# Altium footprint library connectors.PCBLIB: 188 footprints (part 3 of 12)
Each footprint in its own frame and in the unit in brackets; x right, y up, seen from the top. Pads: shape width x height; smd on the part's side, far side on the other; paste and mask are expansions set on the pad; w line width, h text height; cw(c..) or ccw(c..) is an arc to the next point about the centre after c.
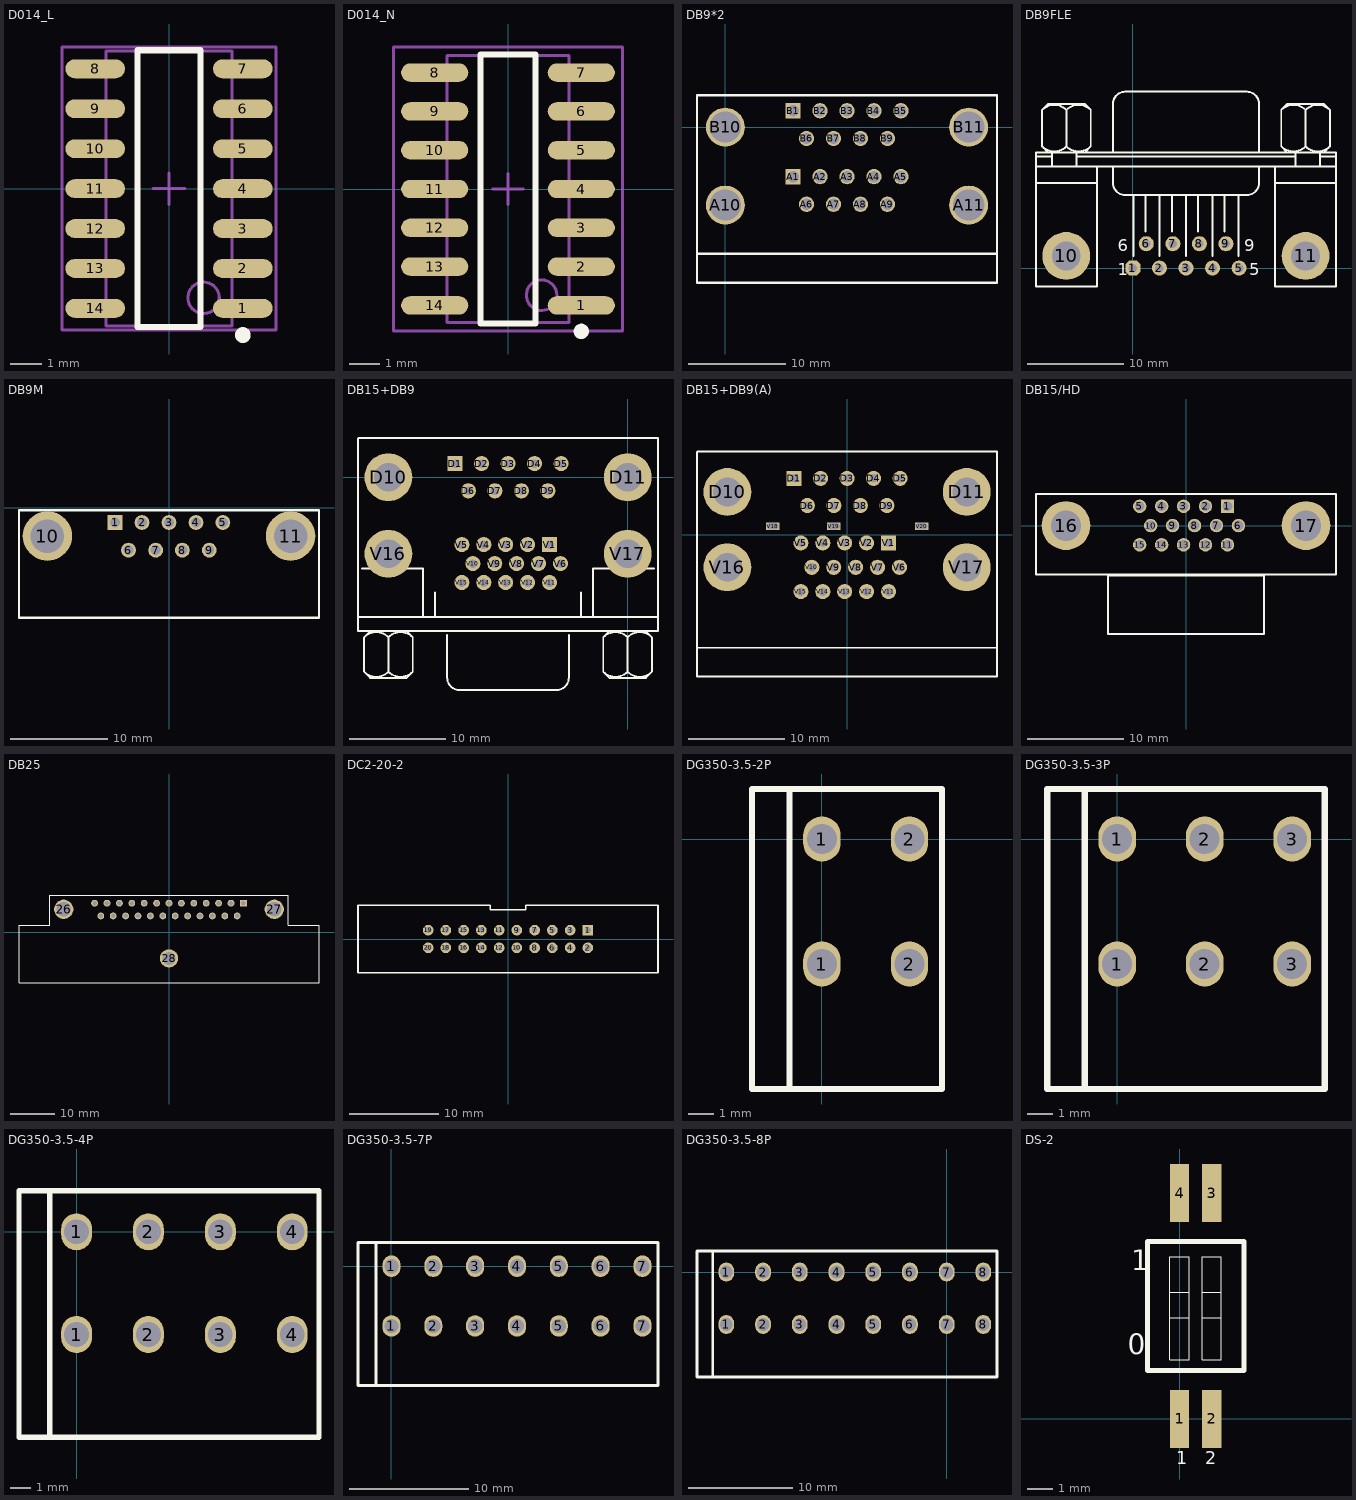
[diagram p2: the footprints below, top view; thin cyan lines are the x and y axes]

## D014_L [mm] "SOIC, 14-Leads, Body 8.7x3.9mm, Pitch 1.27mm, IPC High Density"
height 1.75
pads (14):
  oval 1.9x0.6 smd: 1(2.35,-3.81) 2(2.35,-2.54) 3(2.35,-1.27) 4(2.35,0) 5(2.35,1.27) 6(2.35,2.54) 7(2.35,3.81) 8(-2.35,3.81) 9(-2.35,2.54) 10(-2.35,1.27) 11(-2.35,0) 12(-2.35,-1.27) 13(-2.35,-2.54) 14(-2.35,-3.81)
Top Overlay:
  circle w0.25: c2.35,-4.66 r0.125
  lines w0.2: -1,-4.4 1,-4.4 1,4.4 -1,4.4 -1,-4.4
Mechanical 13:
  circle w0.1: c1.1,-3.475 r0.5
  lines w0.1: -2,-4.375 2,-4.375 2,4.375 -2,4.375 -2,-4.375
Mechanical 15:
  lines w0.1: -0.5,0 0.5,0 ; 0,-0.5 0,0.5 ; -3.4,-4.5 3.4,-4.5 3.4,4.5 -3.4,4.5 -3.4,-4.5
3D body: height 1.75, standoff 0, extent -2,-4.375 2,4.375

## D014_N [mm] "SOIC, 14-Leads, Body 8.7x3.9mm, Pitch 1.27mm, IPC Medium Density"
height 1.75
pads (14):
  oval 2.2x0.6 smd: 1(2.4,-3.81) 2(2.4,-2.54) 3(2.4,-1.27) 4(2.4,0) 5(2.4,1.27) 6(2.4,2.54) 7(2.4,3.81) 8(-2.4,3.81) 9(-2.4,2.54) 10(-2.4,1.27) 11(-2.4,0) 12(-2.4,-1.27) 13(-2.4,-2.54) 14(-2.4,-3.81)
Top Overlay:
  circle w0.25: c2.4,-4.66 r0.125
  lines w0.2: -0.9,-4.4 -0.9,4.4 0.9,4.4 0.9,-4.4 -0.9,-4.4
Mechanical 13:
  circle w0.1: c1.1,-3.475 r0.5
  lines w0.1: -2,-4.375 -2,4.375 2,4.375 2,-4.375 -2,-4.375
Mechanical 15:
  lines w0.1: -0.5,0 0.5,0 ; 0,-0.5 0,0.5 ; -3.75,-4.65 -3.75,4.65 3.75,4.65 3.75,-4.65 -3.75,-4.65
3D body: height 1.75, standoff 0, extent -2,-4.375 2,4.375

## DB9*2 [mm]
pads (22):
  rect 1.575x1.575 hole 1.17: A1(6.965,-5.08) B1(6.965,1.68)
  round 1.575 hole 1.17: A2(9.735,-5.08) A3(12.505,-5.08) A4(15.275,-5.08) A5(18.045,-5.08) A6(8.35,-7.92) A7(11.12,-7.92) A8(13.89,-7.92) A9(16.66,-7.92) B2(9.735,1.68) B3(12.505,1.68) B4(15.275,1.68) B5(18.045,1.68) B6(8.35,-1.16) B7(11.12,-1.16) B8(13.89,-1.16) B9(16.66,-1.16)
  round 4 hole 3.2: A10(0.005,-8) A11(25.005,-8) B10(0.005,0) B11(25.005,0)
Top Overlay:
  lines w0.254: -2.9,-13 27.91,-13 ; -2.9,-16 27.91,-16 27.91,3.3 -2.9,3.3 -2.9,-16

## DB9FLE [mil]
pads (11):
  oct 62x62 hole 35: 1(0,0)
  round 62 hole 35: 2(109.17,0) 3(218.33,0) 4(327.5,0) 5(436.67,0) 6(55,100) 7(164.17,100) 8(273.33,100) 9(382.5,100)
  round 196.67 hole 118.33: 10(-274.17,50) 11(710,50)
Top Overlay:
  lines w8: -398.33,350 -148.33,350 ; -398.33,416.67 835,416.67 ; -398.33,458.33 -331.67,458.33 ; -373.42,499.91 ccw(c-323.33,550) -273.25,499.91 ; -373.42,650.09 cw(c-323.33,600) -273.25,650.09 ; -348.33,475 -373.33,500 -373.33,650 -348.33,675 -198.33,675 -173.33,650 -173.33,500 -198.33,475 ; -331.67,416.67 -331.67,475 ; -273.42,499.91 ccw(c-223.33,550) -173.25,499.91 ; -273.42,650.09 cw(c-223.33,600) -173.25,650.09 ; -273.33,500 -273.33,650 ; -231.67,416.67 -231.67,475 ; -231.67,458.33 668.33,458.33 ; -148.33,416.67 -148.33,-75 -398.33,-75 -398.33,475 835,475 835,-75 585,-75 585,416.67 ; -81.67,416.67 -81.67,350 ccw(c-31.67,350) -31.67,300 468.33,300 ccw(c468.33,350) 518.33,350 518.33,416.67 ; -81.67,475 -81.67,675 cw(c-31.67,675) -31.67,725 468.33,725 cw(c468.33,675) 518.33,675 518.33,475 ; 1.67,50 1.67,300 ; 51.67,150 51.67,300 ; 110,50 110,300 ; 160,150 160,300 ; 218.33,50 218.33,300 ; 268.33,150 268.33,300 ; 326.67,50 326.67,300 ; 376.67,150 376.67,300 ; 435,50 435,300 ; 585,350 835,350 ; 609.91,499.91 ccw(c660,550) 710.09,499.91 ; 609.91,650.09 cw(c660,600) 710.09,650.09 ; 635,475 610,500 610,650 635,675 785,675 810,650 810,500 785,475 ; 668.33,416.67 668.33,475 ; 709.91,499.91 ccw(c760,550) 810.09,499.91 ; 709.91,650.09 cw(c760,600) 810.09,650.09 ; 710,500 710,650 ; 768.33,416.67 768.33,475 ; 768.33,458.33 835,458.33
  text "6" at -61.67,70 h50
  text "1" at -61.67,-30 h50
  text "5" at 478.33,-30 h50
  text "9" at 458.33,70 h50

## DB9M [mil]
pads (11):
  rect 60x60 / inner round 60 / far side rect 60x60 hole 40: 1(-218,-59)
  round 60 hole 40: 2(-109,-59) 3(0,-59) 4(109,-59) 5(218,-59) 6(-164,-171) 7(-54,-171) 8(54,-171) 9(163,-171)
  round 200 hole 135: 10(-492,-114) 11(492,-114)
Top Overlay:
  lines w10: -607,-445 607,-445 607,-9 -607,-9 -607,-445

## DB15+DB9 [mil]
pads (28):
  rect 62x62 hole 35: D1(-710.05,55.91) V1(-321.61,-277.17)
  round 62 hole 35: D2(-601,55.91) D3(-492.08,55.91) D4(-383.03,55.91) D5(-273.97,55.91) D6(-655.52,-55.91) D7(-546.47,-55.91) D8(-437.41,-55.91) D9(-328.36,-55.91) V2(-411.77,-277.17) V3(-501.93,-277.17) V4(-592.08,-277.17) V5(-682.24,-277.17) V6(-276.53,-355.12) V7(-366.69,-355.12) V8(-456.85,-355.12) V9(-547,-355.12) V10(-637.16,-355.12) V11(-321.61,-433.07) V12(-411.77,-433.07) V13(-501.93,-433.07) V14(-592.08,-433.07) V15(-682.24,-433.07)
  round 196.67 hole 118.33: D10(-984.17,0) D11(0,0) V16(-984.17,-314.96) V17(0,-314.96)
Top Overlay:
  lines w8: -1109.17,-574.74 124.16,-574.74 ; -1092.5,-374.74 -842.5,-374.74 -842.5,-574.74 ; -1084.25,-799.82 ccw(c-1034.17,-749.74) -984.08,-799.82 ; -1084.25,-657.99 cw(c-1034.17,-708.07) -984.08,-657.99 ; -1059.17,-633.07 -1084.17,-658.07 -1084.17,-799.74 -1059.17,-824.74 -909.17,-824.74 -884.17,-799.74 -884.17,-658.07 -909.17,-633.07 ; -1042.5,-374.74 -1042.5,-274.74 ; -1017.5,-374.74 -1017.5,-349.74 cw(c-992.5,-349.74) -967.5,-349.74 -967.5,-374.74 ; -984.25,-799.82 ccw(c-934.17,-749.74) -884.08,-799.82 ; -984.25,-657.99 cw(c-934.17,-708.07) -884.08,-657.99 ; -984.17,-799.74 -984.17,-658.07 ; -942.5,-374.74 -942.5,-274.74 ; -792.5,-574.74 -792.5,-474.74 ; -742.5,-649.74 -742.5,-824.74 ccw(c-692.5,-824.74) -692.5,-874.74 -667.5,-874.74 -292.5,-874.74 ccw(c-292.5,-824.74) -242.5,-824.74 -242.5,-649.74 ; -192.5,-574.74 -192.5,-474.74 ; -142.5,-574.74 -142.5,-374.74 107.5,-374.74 ; -100.92,-799.82 ccw(c-50.84,-749.74) -0.75,-799.82 ; -100.92,-657.99 cw(c-50.84,-708.07) -0.75,-657.99 ; -75.84,-633.07 -100.84,-658.07 -100.84,-799.74 -75.84,-824.74 74.16,-824.74 99.16,-799.74 99.16,-658.07 74.16,-633.07 ; -42.5,-374.74 -42.5,-274.74 ; -17.5,-374.74 -17.5,-349.74 cw(c7.5,-349.74) 32.5,-349.74 32.5,-374.74 ; -0.92,-799.82 ccw(c49.16,-749.74) 99.25,-799.82 ; -0.92,-657.99 cw(c49.16,-708.07) 99.25,-657.99 ; -0.84,-799.74 -0.84,-658.07 ; 57.5,-374.74 57.5,-274.74 ; -1109.17,-633.07 -1109.17,-49.74 -1109.17,157.87 -1106.2,160.84 123.8,160.84 124.16,160.48 124.16,-49.74 124.16,-633.07 -1109.17,-633.07

## DB15+DB9(A) [mil]
pads (31):
  rect 62x62 hole 35: D1(-217.97,232.87) V1(170.47,-32.87)
  round 62 hole 35: D2(-108.91,232.87) D3(-0.16,232.87) D4(109.06,232.87) D5(218.11,232.87) D6(-163.44,121.06) D7(-54.38,121.06) D8(54.67,121.06) D9(163.73,121.06) V2(80.32,-32.87) V3(-9.84,-32.87) V4(-100,-32.87) V5(-190.16,-32.87) V6(215.55,-132.87) V7(125.4,-132.87) V8(35.24,-132.87) V9(-54.92,-132.87) V10(-145.08,-132.87) V11(170.47,-232.87) V12(80.32,-232.87) V13(-9.84,-232.87) V14(-100,-232.87) V15(-190.16,-232.87)
  round 196.67 hole 118.33: D10(-492.08,176.97) D11(492.08,176.97) V16(-492.08,-132.87) V17(492.08,-132.87)
  rect 55.12x31.5 hole 23.62 slot 47.24 at 0 deg: V18(-305.96,35.63) V19(-54.38,35.63) V20(306.25,35.63)
Top Overlay:
  lines w8: -617.08,-463.58 616.25,-463.58 ; -550.42,-192.65 -550.42,-92.65 ; -525.42,-192.65 -525.42,-167.65 cw(c-500.42,-167.65) -475.42,-167.65 -475.42,-192.65 ; -450.42,-192.65 -450.42,-92.65 ; 449.58,-192.65 449.58,-92.65 ; 474.58,-192.65 474.58,-167.65 cw(c499.58,-167.65) 524.58,-167.65 524.58,-192.65 ; 549.58,-192.65 549.58,-92.65 ; 615.26,-581.69 -617.08,-581.69 -617.08,132.35 -617.08,339.96 -614.11,342.93 615.89,342.93 616.25,342.57 616.25,132.35 616.25,-581.69

## DB15/HD [mil]
pads (17):
  rect 55x55 / inner round 55 / far side rect 55x55 hole 40: 1(170,79)
  round 55 hole 40: 2(80,79) 3(-10,79) 4(-100,79) 5(-190,79) 6(215,0) 7(125,0) 8(35,0) 9(-55,0) 10(-145,0) 11(170,-79) 12(80,-79) 13(-10,-79) 14(-100,-79) 15(-190,-79)
  round 200 / inner round 145 / far side round 200 hole 125: 16(-492,0) 17(492,0)
Top Overlay:
  lines w8: -615,-200 -615,130 615,130 615,-200 -615,-200 ; -320,-445 -320,-205 320,-205 320,-445 -320,-445

## DB25 [mil]
pads (28):
  rect 60x60 / inner round 60 / far side round 60 hole 40: 1(654.33,255)
  round 60 hole 40: 2(545.27,255) 3(436.22,255) 4(327.16,255) 5(218.11,255) 6(109.05,255) 7(0,255) 8(-109.06,255) 9(-218.11,255) 10(-327.17,255) 11(-436.22,255) 12(-545.28,255) 13(-654.33,255) 14(599.8,143.19) 15(490.75,143.19) 16(381.69,143.19) 17(272.64,143.19) 18(163.58,143.19) 19(54.53,143.19) 20(-54.53,143.19) 21(-163.58,143.19) 22(-272.64,143.19) 23(-381.69,143.19) 24(-490.75,143.19) 25(-599.8,143.19)
  round 170 hole 125: 26(-925.98,201.46) 27(925.98,201.46)
  round 160 hole 115: 28(0,-230)
Top Overlay:
  lines w10: -1319.1,-445 1319.09,-445 1319.09,63.07 1048.03,63.07 1048.03,325.87 -1048.03,325.87 -1048.03,63.07 -1319.1,63.07 -1319.1,-445

## DC2-20-2 [mm]
pads (20):
  rect 1.2x1.2 hole 0.7: 1(9,1)
  round 1.2 hole 0.7: 2(9,-1) 3(7,1) 4(7,-1) 5(5,1) 6(5,-1) 7(3,1) 8(3,-1) 9(1,1) 10(1,-1) 11(-1,1) 12(-1,-1) 13(-3,1) 14(-3,-1) 15(-5,1) 16(-5,-1) 17(-7,1) 18(-7,-1) 19(-9,1) 20(-9,-1)
Top Overlay:
  lines w0.2: -16.9,3.8 -16.9,2.5 -16.9,-2.5 -16.9,-3.81 -13.75,-3.81 13.75,-3.81 16.9,-3.81 16.9,-2.5 16.9,2.5 16.9,3.81 13.75,3.81 2,3.81 2,3.285 -2,3.285 -2,3.81 -13.75,3.81 -16.9,3.81

## DG350-3.5-2P [mm]
pads (4):
  oval 1.5x1.8 hole 1.2: 1(0,-5) 1(0,0) 2(3.5,-5) 2(3.5,0)
Top Overlay:
  lines w0.254: -1.3,-10 -1.3,2 ; -2.8,-10 4.8,-10 4.8,2 -2.8,2 -2.8,-10

## DG350-3.5-3P [mm]
pads (6):
  oval 1.5x1.8 hole 1.2: 1(0,-5) 1(0,0) 2(3.5,-5) 2(3.5,0) 3(7,-5) 3(7,0)
Top Overlay:
  lines w0.254: -1.3,-10 -1.3,2 ; 8.25,-10 -2.8,-10 -2.8,2 8.3,2 8.3,-10

## DG350-3.5-4P [mm]
pads (8):
  oval 1.5x1.8 hole 1.2: 1(0,-5) 1(0,0) 2(3.5,-5) 2(3.5,0) 3(7,-5) 3(7,0) 4(10.5,-5) 4(10.5,0)
Top Overlay:
  lines w0.254: -1.3,-10 -1.3,2 ; -2.8,-10 -2.8,2 11.8,2 11.8,-10 -2.8,-10

## DG350-3.5-7P [mm]
pads (14):
  oval 1.5x1.8 hole 1.2: 1(0,-5) 1(0,0) 2(3.5,-5) 2(3.5,0) 3(7,-5) 3(7,0) 4(10.5,-5) 4(10.5,0) 5(14,-5) 5(14,0) 6(17.5,-5) 6(17.5,0) 7(21,-5) 7(21,0)
Top Overlay:
  lines w0.254: -1.3,-10 -1.3,2 ; -2.8,-10 22.3,-10 22.3,2 -2.8,2 -2.8,-10

## DG350-3.5-8P [mm]
pads (16):
  oval 1.5x1.8 hole 1.2: 1(-21,-5) 1(-21,0) 2(-17.5,-5) 2(-17.5,0) 3(-14,-5) 3(-14,0) 4(-10.5,-5) 4(-10.5,0) 5(-7,-5) 5(-7,0) 6(-3.5,-5) 6(-3.5,0) 7(0,-5) 7(0,0) 8(3.5,-5) 8(3.5,0)
Top Overlay:
  lines w0.254: -22.3,-10 -22.3,2 ; -23.8,-10 4.8,-10 4.8,2 -23.8,2 -23.8,-10

## DS-2 [mil]
pads (4):
  rect 30x90 smd: 1(0,0) 2(50,0) 3(50,350) 4(0,350)
Top Overlay:
  lines w0.98: -15,156.57 15,156.57 ; -15,196.57 15,196.57 ; 35,156.57 65,156.57 ; 35,196.57 65,196.57 ; -15,91.57 -15,131.57 -15,211.57 -15,251.57 15,251.57 15,91.57 -15,91.57 ; 35,91.57 65,91.57 65,251.57 35,251.57 35,91.57
  lines w7.87: -50,75 -50,275 100,275 100,75 -50,75
  text "2" at 40,-70 h19.68
  text "1" at -5,-70 h19.68
  text "1" at -75,230 h31.5
  text "0" at -80,100 h31.5